# Altium footprint library texas.PCBLIB: 124 footprints (part 5 of 12)
Each footprint in its own frame and in the unit in brackets; x right, y up, seen from the top. Pads: shape width x height; smd on the part's side, far side on the other; paste and mask are expansions set on the pad; w line width, h text height; cw(c..) or ccw(c..) is an arc to the next point about the centre after c.
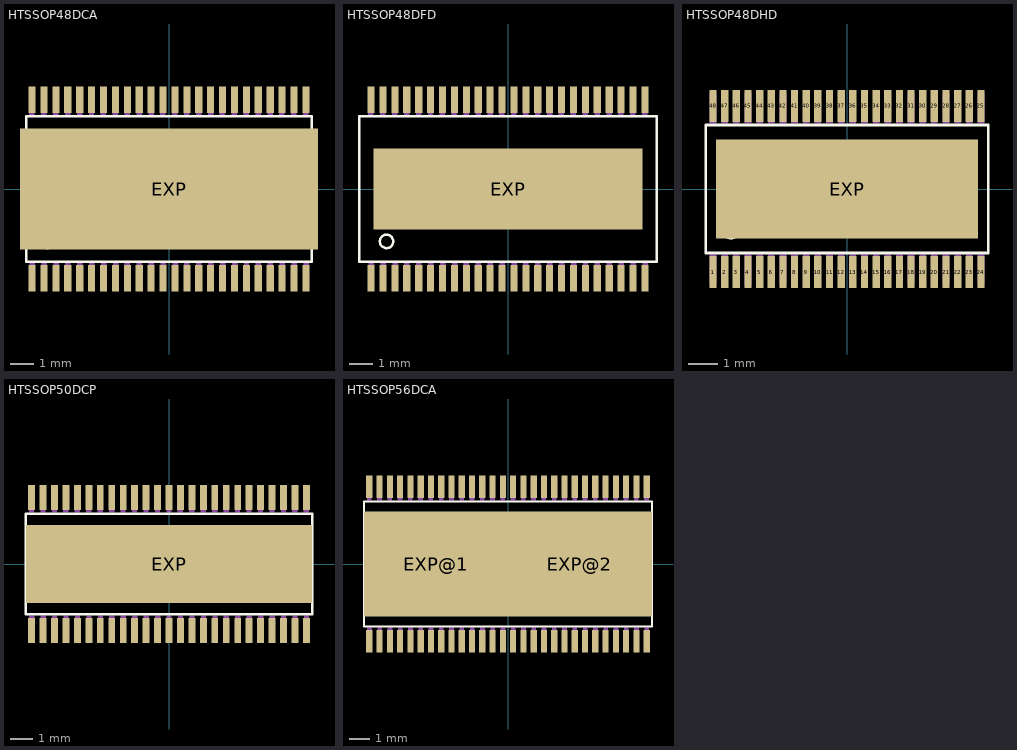
[diagram p4: the footprints below, top view; thin cyan lines are the x and y axes]

## HTSSOP48DCA [mm]
pads (49):
  rect 0.3x1.1 smd: 1(-5.75,-3.75) 2(-5.25,-3.75) 3(-4.75,-3.75) 4(-4.25,-3.75) 5(-3.75,-3.75) 6(-3.25,-3.75) 7(-2.75,-3.75) 8(-2.25,-3.75) 9(-1.75,-3.75) 10(-1.25,-3.75) 11(-0.75,-3.75) 12(-0.25,-3.75) 13(0.25,-3.75) 14(0.75,-3.75) 15(1.25,-3.75) 16(1.75,-3.75) 17(2.25,-3.75) 18(2.75,-3.75) 19(3.25,-3.75) 20(3.75,-3.75) 21(4.25,-3.75) 22(4.75,-3.75) 23(5.25,-3.75) 24(5.75,-3.75) 25(5.75,3.75) 26(5.25,3.75) 27(4.75,3.75) 28(4.25,3.75) 29(3.75,3.75) 30(3.25,3.75) 31(2.75,3.75) 32(2.25,3.75) 33(1.75,3.75) 34(1.25,3.75) 35(0.75,3.75) 36(0.25,3.75) 37(-0.25,3.75) 38(-0.75,3.75) 39(-1.25,3.75) 40(-1.75,3.75) 41(-2.25,3.75) 42(-2.75,3.75) 43(-3.25,3.75) 44(-3.75,3.75) 45(-4.25,3.75) 46(-4.75,3.75) 47(-5.25,3.75) 48(-5.75,3.75)
  rect 12.5x5.1 smd: EXP(0,0)
Top Overlay:
  circle w0.102: c-5.1,-2.2 r0.283
  lines w0.102: -6,-3.05 6,-3.05 6,3.05 -6,3.05 -6,-3.05
Top Paste:
  rectangle: -5.89,-4.285 -5.61,-3.215
  rectangle: -5.39,-4.285 -5.11,-3.215
  rectangle: -4.89,-4.285 -4.61,-3.215
  rectangle: -4.39,-4.285 -4.11,-3.215
  rectangle: -3.89,-4.285 -3.61,-3.215
  rectangle: -3.39,-4.285 -3.11,-3.215
  rectangle: -2.89,-4.285 -2.61,-3.215
  rectangle: -2.39,-4.285 -2.11,-3.215
  rectangle: -1.89,-4.285 -1.61,-3.215
  rectangle: -1.39,-4.285 -1.11,-3.215
  rectangle: -0.89,-4.285 -0.61,-3.215
  rectangle: -0.39,-4.285 -0.11,-3.215
  rectangle: 0.11,-4.285 0.39,-3.215
  rectangle: 0.61,-4.285 0.89,-3.215
  rectangle: 1.11,-4.285 1.39,-3.215
  rectangle: 1.61,-4.285 1.89,-3.215
  rectangle: 2.11,-4.285 2.39,-3.215
  rectangle: 2.61,-4.285 2.89,-3.215
  rectangle: 3.11,-4.285 3.39,-3.215
  rectangle: 3.61,-4.285 3.89,-3.215
  rectangle: 4.11,-4.285 4.39,-3.215
  rectangle: 4.61,-4.285 4.89,-3.215
  rectangle: 5.11,-4.285 5.39,-3.215
  rectangle: 5.61,-4.285 5.89,-3.215
  region: 5.89,4.285 5.61,4.285 5.61,3.215 5.89,3.215
  region: 5.39,4.285 5.11,4.285 5.11,3.215 5.39,3.215
  region: 4.89,4.285 4.61,4.285 4.61,3.215 4.89,3.215
  region: 4.39,4.285 4.11,4.285 4.11,3.215 4.39,3.215
  region: 3.89,4.285 3.61,4.285 3.61,3.215 3.89,3.215
  region: 3.39,4.285 3.11,4.285 3.11,3.215 3.39,3.215
  region: 2.89,4.285 2.61,4.285 2.61,3.215 2.89,3.215
  region: 2.39,4.285 2.11,4.285 2.11,3.215 2.39,3.215
  region: 1.89,4.285 1.61,4.285 1.61,3.215 1.89,3.215
  region: 1.39,4.285 1.11,4.285 1.11,3.215 1.39,3.215
  region: 0.89,4.285 0.61,4.285 0.61,3.215 0.89,3.215
  region: 0.39,4.285 0.11,4.285 0.11,3.215 0.39,3.215
  region: -0.11,4.285 -0.39,4.285 -0.39,3.215 -0.11,3.215
  region: -0.61,4.285 -0.89,4.285 -0.89,3.215 -0.61,3.215
  region: -1.11,4.285 -1.39,4.285 -1.39,3.215 -1.11,3.215
  region: -1.61,4.285 -1.89,4.285 -1.89,3.215 -1.61,3.215
  region: -2.11,4.285 -2.39,4.285 -2.39,3.215 -2.11,3.215
  region: -2.61,4.285 -2.89,4.285 -2.89,3.215 -2.61,3.215
  region: -3.11,4.285 -3.39,4.285 -3.39,3.215 -3.11,3.215
  region: -3.61,4.285 -3.89,4.285 -3.89,3.215 -3.61,3.215
  region: -4.11,4.285 -4.39,4.285 -4.39,3.215 -4.11,3.215
  region: -4.61,4.285 -4.89,4.285 -4.89,3.215 -4.61,3.215
  region: -5.11,4.285 -5.39,4.285 -5.39,3.215 -5.11,3.215
  region: -5.61,4.285 -5.89,4.285 -5.89,3.215 -5.61,3.215
Top Solder:
  rectangle: -5.905,-4.305 -5.595,-3.195
  rectangle: -5.405,-4.305 -5.095,-3.195
  rectangle: -4.905,-4.305 -4.595,-3.195
  rectangle: -4.405,-4.305 -4.095,-3.195
  rectangle: -3.905,-4.305 -3.595,-3.195
  rectangle: -3.405,-4.305 -3.095,-3.195
  rectangle: -2.905,-4.305 -2.595,-3.195
  rectangle: -2.405,-4.305 -2.095,-3.195
  rectangle: -1.905,-4.305 -1.595,-3.195
  rectangle: -1.405,-4.305 -1.095,-3.195
  rectangle: -0.905,-4.305 -0.595,-3.195
  rectangle: -0.405,-4.305 -0.095,-3.195
  rectangle: 0.095,-4.305 0.405,-3.195
  rectangle: 0.595,-4.305 0.905,-3.195
  rectangle: 1.095,-4.305 1.405,-3.195
  rectangle: 1.595,-4.305 1.905,-3.195
  rectangle: 2.095,-4.305 2.405,-3.195
  rectangle: 2.595,-4.305 2.905,-3.195
  rectangle: 3.095,-4.305 3.405,-3.195
  rectangle: 3.595,-4.305 3.905,-3.195
  rectangle: 4.095,-4.305 4.405,-3.195
  rectangle: 4.595,-4.305 4.905,-3.195
  rectangle: 5.095,-4.305 5.405,-3.195
  rectangle: 5.595,-4.305 5.905,-3.195
  region: 5.905,4.305 5.595,4.305 5.595,3.195 5.905,3.195
  region: 5.405,4.305 5.095,4.305 5.095,3.195 5.405,3.195
  region: 4.905,4.305 4.595,4.305 4.595,3.195 4.905,3.195
  region: 4.405,4.305 4.095,4.305 4.095,3.195 4.405,3.195
  region: 3.905,4.305 3.595,4.305 3.595,3.195 3.905,3.195
  region: 3.405,4.305 3.095,4.305 3.095,3.195 3.405,3.195
  region: 2.905,4.305 2.595,4.305 2.595,3.195 2.905,3.195
  region: 2.405,4.305 2.095,4.305 2.095,3.195 2.405,3.195
  region: 1.905,4.305 1.595,4.305 1.595,3.195 1.905,3.195
  region: 1.405,4.305 1.095,4.305 1.095,3.195 1.405,3.195
  region: 0.905,4.305 0.595,4.305 0.595,3.195 0.905,3.195
  region: 0.405,4.305 0.095,4.305 0.095,3.195 0.405,3.195
  region: -0.095,4.305 -0.405,4.305 -0.405,3.195 -0.095,3.195
  region: -0.595,4.305 -0.905,4.305 -0.905,3.195 -0.595,3.195
  region: -1.095,4.305 -1.405,4.305 -1.405,3.195 -1.095,3.195
  region: -1.595,4.305 -1.905,4.305 -1.905,3.195 -1.595,3.195
  region: -2.095,4.305 -2.405,4.305 -2.405,3.195 -2.095,3.195
  region: -2.595,4.305 -2.905,4.305 -2.905,3.195 -2.595,3.195
  region: -3.095,4.305 -3.405,4.305 -3.405,3.195 -3.095,3.195
  region: -3.595,4.305 -3.905,4.305 -3.905,3.195 -3.595,3.195
  region: -4.095,4.305 -4.405,4.305 -4.405,3.195 -4.095,3.195
  region: -4.595,4.305 -4.905,4.305 -4.905,3.195 -4.595,3.195
  region: -5.095,4.305 -5.405,4.305 -5.405,3.195 -5.095,3.195
  region: -5.595,4.305 -5.905,4.305 -5.905,3.195 -5.595,3.195
  rectangle: -6.245,-2.55 6.25,2.55
Mechanical 16:
  rectangle: -5.86,-4.15 -5.63,-3.095
  rectangle: -5.36,-4.15 -5.13,-3.095
  rectangle: -4.86,-4.15 -4.63,-3.095
  rectangle: -4.36,-4.15 -4.13,-3.095
  rectangle: -3.86,-4.15 -3.63,-3.095
  rectangle: -3.36,-4.15 -3.13,-3.095
  rectangle: -2.86,-4.15 -2.63,-3.095
  rectangle: -2.36,-4.15 -2.13,-3.095
  rectangle: -1.86,-4.15 -1.63,-3.095
  rectangle: -1.36,-4.15 -1.13,-3.095
  rectangle: -0.86,-4.15 -0.63,-3.095
  rectangle: -0.36,-4.15 -0.13,-3.095
  rectangle: 0.14,-4.15 0.37,-3.095
  rectangle: 0.64,-4.15 0.87,-3.095
  rectangle: 1.14,-4.15 1.37,-3.095
  rectangle: 1.64,-4.15 1.87,-3.095
  rectangle: 2.14,-4.15 2.37,-3.095
  rectangle: 2.64,-4.15 2.87,-3.095
  rectangle: 3.14,-4.15 3.37,-3.095
  rectangle: 3.64,-4.15 3.87,-3.095
  rectangle: 4.14,-4.15 4.37,-3.095
  rectangle: 4.64,-4.15 4.87,-3.095
  rectangle: 5.14,-4.15 5.37,-3.095
  rectangle: 5.64,-4.15 5.87,-3.095
  region: 5.86,4.15 5.63,4.15 5.63,3.095 5.86,3.095
  region: 5.36,4.15 5.13,4.15 5.13,3.095 5.36,3.095
  region: 4.86,4.15 4.63,4.15 4.63,3.095 4.86,3.095
  region: 4.36,4.15 4.13,4.15 4.13,3.095 4.36,3.095
  region: 3.86,4.15 3.63,4.15 3.63,3.095 3.86,3.095
  region: 3.36,4.15 3.13,4.15 3.13,3.095 3.36,3.095
  region: 2.86,4.15 2.63,4.15 2.63,3.095 2.86,3.095
  region: 2.36,4.15 2.13,4.15 2.13,3.095 2.36,3.095
  region: 1.86,4.15 1.63,4.15 1.63,3.095 1.86,3.095
  region: 1.36,4.15 1.13,4.15 1.13,3.095 1.36,3.095
  region: 0.86,4.15 0.63,4.15 0.63,3.095 0.86,3.095
  region: 0.36,4.15 0.13,4.15 0.13,3.095 0.36,3.095
  region: -0.14,4.15 -0.37,4.15 -0.37,3.095 -0.14,3.095
  region: -0.64,4.15 -0.87,4.15 -0.87,3.095 -0.64,3.095
  region: -1.14,4.15 -1.37,4.15 -1.37,3.095 -1.14,3.095
  region: -1.64,4.15 -1.87,4.15 -1.87,3.095 -1.64,3.095
  region: -2.14,4.15 -2.37,4.15 -2.37,3.095 -2.14,3.095
  region: -2.64,4.15 -2.87,4.15 -2.87,3.095 -2.64,3.095
  region: -3.14,4.15 -3.37,4.15 -3.37,3.095 -3.14,3.095
  region: -3.64,4.15 -3.87,4.15 -3.87,3.095 -3.64,3.095
  region: -4.14,4.15 -4.37,4.15 -4.37,3.095 -4.14,3.095
  region: -4.64,4.15 -4.87,4.15 -4.87,3.095 -4.64,3.095
  region: -5.14,4.15 -5.37,4.15 -5.37,3.095 -5.14,3.095
  region: -5.64,4.15 -5.87,4.15 -5.87,3.095 -5.64,3.095

## HTSSOP48DFD [mm]
pads (49):
  rect 0.3x1.1 smd: 1(-5.75,-3.75) 2(-5.25,-3.75) 3(-4.75,-3.75) 4(-4.25,-3.75) 5(-3.75,-3.75) 6(-3.25,-3.75) 7(-2.75,-3.75) 8(-2.25,-3.75) 9(-1.75,-3.75) 10(-1.25,-3.75) 11(-0.75,-3.75) 12(-0.25,-3.75) 13(0.25,-3.75) 14(0.75,-3.75) 15(1.25,-3.75) 16(1.75,-3.75) 17(2.25,-3.75) 18(2.75,-3.75) 19(3.25,-3.75) 20(3.75,-3.75) 21(4.25,-3.75) 22(4.75,-3.75) 23(5.25,-3.75) 24(5.75,-3.75) 25(5.75,3.75) 26(5.25,3.75) 27(4.75,3.75) 28(4.25,3.75) 29(3.75,3.75) 30(3.25,3.75) 31(2.75,3.75) 32(2.25,3.75) 33(1.75,3.75) 34(1.25,3.75) 35(0.75,3.75) 36(0.25,3.75) 37(-0.25,3.75) 38(-0.75,3.75) 39(-1.25,3.75) 40(-1.75,3.75) 41(-2.25,3.75) 42(-2.75,3.75) 43(-3.25,3.75) 44(-3.75,3.75) 45(-4.25,3.75) 46(-4.75,3.75) 47(-5.25,3.75) 48(-5.75,3.75)
  rect 11.3x3.4 smd: EXP(0,0)
Top Overlay:
  circle w0.102: c-5.1,-2.2 r0.283
  lines w0.102: -6.25,-3.05 6.25,-3.05 6.25,3.05 -6.25,3.05 -6.25,-3.05
Top Paste:
  rectangle: -5.89,-4.285 -5.61,-3.215
  rectangle: -5.39,-4.285 -5.11,-3.215
  rectangle: -4.89,-4.285 -4.61,-3.215
  rectangle: -4.39,-4.285 -4.11,-3.215
  rectangle: -3.89,-4.285 -3.61,-3.215
  rectangle: -3.39,-4.285 -3.11,-3.215
  rectangle: -2.89,-4.285 -2.61,-3.215
  rectangle: -2.39,-4.285 -2.11,-3.215
  rectangle: -1.89,-4.285 -1.61,-3.215
  rectangle: -1.39,-4.285 -1.11,-3.215
  rectangle: -0.89,-4.285 -0.61,-3.215
  rectangle: -0.39,-4.285 -0.11,-3.215
  rectangle: 0.11,-4.285 0.39,-3.215
  rectangle: 0.61,-4.285 0.89,-3.215
  rectangle: 1.11,-4.285 1.39,-3.215
  rectangle: 1.61,-4.285 1.89,-3.215
  rectangle: 2.11,-4.285 2.39,-3.215
  rectangle: 2.61,-4.285 2.89,-3.215
  rectangle: 3.11,-4.285 3.39,-3.215
  rectangle: 3.61,-4.285 3.89,-3.215
  rectangle: 4.11,-4.285 4.39,-3.215
  rectangle: 4.61,-4.285 4.89,-3.215
  rectangle: 5.11,-4.285 5.39,-3.215
  rectangle: 5.61,-4.285 5.89,-3.215
  region: 5.89,4.285 5.61,4.285 5.61,3.215 5.89,3.215
  region: 5.39,4.285 5.11,4.285 5.11,3.215 5.39,3.215
  region: 4.89,4.285 4.61,4.285 4.61,3.215 4.89,3.215
  region: 4.39,4.285 4.11,4.285 4.11,3.215 4.39,3.215
  region: 3.89,4.285 3.61,4.285 3.61,3.215 3.89,3.215
  region: 3.39,4.285 3.11,4.285 3.11,3.215 3.39,3.215
  region: 2.89,4.285 2.61,4.285 2.61,3.215 2.89,3.215
  region: 2.39,4.285 2.11,4.285 2.11,3.215 2.39,3.215
  region: 1.89,4.285 1.61,4.285 1.61,3.215 1.89,3.215
  region: 1.39,4.285 1.11,4.285 1.11,3.215 1.39,3.215
  region: 0.89,4.285 0.61,4.285 0.61,3.215 0.89,3.215
  region: 0.39,4.285 0.11,4.285 0.11,3.215 0.39,3.215
  region: -0.11,4.285 -0.39,4.285 -0.39,3.215 -0.11,3.215
  region: -0.61,4.285 -0.89,4.285 -0.89,3.215 -0.61,3.215
  region: -1.11,4.285 -1.39,4.285 -1.39,3.215 -1.11,3.215
  region: -1.61,4.285 -1.89,4.285 -1.89,3.215 -1.61,3.215
  region: -2.11,4.285 -2.39,4.285 -2.39,3.215 -2.11,3.215
  region: -2.61,4.285 -2.89,4.285 -2.89,3.215 -2.61,3.215
  region: -3.11,4.285 -3.39,4.285 -3.39,3.215 -3.11,3.215
  region: -3.61,4.285 -3.89,4.285 -3.89,3.215 -3.61,3.215
  region: -4.11,4.285 -4.39,4.285 -4.39,3.215 -4.11,3.215
  region: -4.61,4.285 -4.89,4.285 -4.89,3.215 -4.61,3.215
  region: -5.11,4.285 -5.39,4.285 -5.39,3.215 -5.11,3.215
  region: -5.61,4.285 -5.89,4.285 -5.89,3.215 -5.61,3.215
Top Solder:
  rectangle: -5.905,-4.305 -5.595,-3.195
  rectangle: -5.405,-4.305 -5.095,-3.195
  rectangle: -4.905,-4.305 -4.595,-3.195
  rectangle: -4.405,-4.305 -4.095,-3.195
  rectangle: -3.905,-4.305 -3.595,-3.195
  rectangle: -3.405,-4.305 -3.095,-3.195
  rectangle: -2.905,-4.305 -2.595,-3.195
  rectangle: -2.405,-4.305 -2.095,-3.195
  rectangle: -1.905,-4.305 -1.595,-3.195
  rectangle: -1.405,-4.305 -1.095,-3.195
  rectangle: -0.905,-4.305 -0.595,-3.195
  rectangle: -0.405,-4.305 -0.095,-3.195
  rectangle: 0.095,-4.305 0.405,-3.195
  rectangle: 0.595,-4.305 0.905,-3.195
  rectangle: 1.095,-4.305 1.405,-3.195
  rectangle: 1.595,-4.305 1.905,-3.195
  rectangle: 2.095,-4.305 2.405,-3.195
  rectangle: 2.595,-4.305 2.905,-3.195
  rectangle: 3.095,-4.305 3.405,-3.195
  rectangle: 3.595,-4.305 3.905,-3.195
  rectangle: 4.095,-4.305 4.405,-3.195
  rectangle: 4.595,-4.305 4.905,-3.195
  rectangle: 5.095,-4.305 5.405,-3.195
  rectangle: 5.595,-4.305 5.905,-3.195
  region: 5.905,4.305 5.595,4.305 5.595,3.195 5.905,3.195
  region: 5.405,4.305 5.095,4.305 5.095,3.195 5.405,3.195
  region: 4.905,4.305 4.595,4.305 4.595,3.195 4.905,3.195
  region: 4.405,4.305 4.095,4.305 4.095,3.195 4.405,3.195
  region: 3.905,4.305 3.595,4.305 3.595,3.195 3.905,3.195
  region: 3.405,4.305 3.095,4.305 3.095,3.195 3.405,3.195
  region: 2.905,4.305 2.595,4.305 2.595,3.195 2.905,3.195
  region: 2.405,4.305 2.095,4.305 2.095,3.195 2.405,3.195
  region: 1.905,4.305 1.595,4.305 1.595,3.195 1.905,3.195
  region: 1.405,4.305 1.095,4.305 1.095,3.195 1.405,3.195
  region: 0.905,4.305 0.595,4.305 0.595,3.195 0.905,3.195
  region: 0.405,4.305 0.095,4.305 0.095,3.195 0.405,3.195
  region: -0.095,4.305 -0.405,4.305 -0.405,3.195 -0.095,3.195
  region: -0.595,4.305 -0.905,4.305 -0.905,3.195 -0.595,3.195
  region: -1.095,4.305 -1.405,4.305 -1.405,3.195 -1.095,3.195
  region: -1.595,4.305 -1.905,4.305 -1.905,3.195 -1.595,3.195
  region: -2.095,4.305 -2.405,4.305 -2.405,3.195 -2.095,3.195
  region: -2.595,4.305 -2.905,4.305 -2.905,3.195 -2.595,3.195
  region: -3.095,4.305 -3.405,4.305 -3.405,3.195 -3.095,3.195
  region: -3.595,4.305 -3.905,4.305 -3.905,3.195 -3.595,3.195
  region: -4.095,4.305 -4.405,4.305 -4.405,3.195 -4.095,3.195
  region: -4.595,4.305 -4.905,4.305 -4.905,3.195 -4.595,3.195
  region: -5.095,4.305 -5.405,4.305 -5.405,3.195 -5.095,3.195
  region: -5.595,4.305 -5.905,4.305 -5.905,3.195 -5.595,3.195
  rectangle: -5.65,-1.7 5.65,1.7
Mechanical 16:
  rectangle: -5.86,-4.15 -5.63,-3.095
  rectangle: -5.36,-4.15 -5.13,-3.095
  rectangle: -4.86,-4.15 -4.63,-3.095
  rectangle: -4.36,-4.15 -4.13,-3.095
  rectangle: -3.86,-4.15 -3.63,-3.095
  rectangle: -3.36,-4.15 -3.13,-3.095
  rectangle: -2.86,-4.15 -2.63,-3.095
  rectangle: -2.36,-4.15 -2.13,-3.095
  rectangle: -1.86,-4.15 -1.63,-3.095
  rectangle: -1.36,-4.15 -1.13,-3.095
  rectangle: -0.86,-4.15 -0.63,-3.095
  rectangle: -0.36,-4.15 -0.13,-3.095
  rectangle: 0.14,-4.15 0.37,-3.095
  rectangle: 0.64,-4.15 0.87,-3.095
  rectangle: 1.14,-4.15 1.37,-3.095
  rectangle: 1.64,-4.15 1.87,-3.095
  rectangle: 2.14,-4.15 2.37,-3.095
  rectangle: 2.64,-4.15 2.87,-3.095
  rectangle: 3.14,-4.15 3.37,-3.095
  rectangle: 3.64,-4.15 3.87,-3.095
  rectangle: 4.14,-4.15 4.37,-3.095
  rectangle: 4.64,-4.15 4.87,-3.095
  rectangle: 5.14,-4.15 5.37,-3.095
  rectangle: 5.64,-4.15 5.87,-3.095
  region: 5.86,4.15 5.63,4.15 5.63,3.095 5.86,3.095
  region: 5.36,4.15 5.13,4.15 5.13,3.095 5.36,3.095
  region: 4.86,4.15 4.63,4.15 4.63,3.095 4.86,3.095
  region: 4.36,4.15 4.13,4.15 4.13,3.095 4.36,3.095
  region: 3.86,4.15 3.63,4.15 3.63,3.095 3.86,3.095
  region: 3.36,4.15 3.13,4.15 3.13,3.095 3.36,3.095
  region: 2.86,4.15 2.63,4.15 2.63,3.095 2.86,3.095
  region: 2.36,4.15 2.13,4.15 2.13,3.095 2.36,3.095
  region: 1.86,4.15 1.63,4.15 1.63,3.095 1.86,3.095
  region: 1.36,4.15 1.13,4.15 1.13,3.095 1.36,3.095
  region: 0.86,4.15 0.63,4.15 0.63,3.095 0.86,3.095
  region: 0.36,4.15 0.13,4.15 0.13,3.095 0.36,3.095
  region: -0.14,4.15 -0.37,4.15 -0.37,3.095 -0.14,3.095
  region: -0.64,4.15 -0.87,4.15 -0.87,3.095 -0.64,3.095
  region: -1.14,4.15 -1.37,4.15 -1.37,3.095 -1.14,3.095
  region: -1.64,4.15 -1.87,4.15 -1.87,3.095 -1.64,3.095
  region: -2.14,4.15 -2.37,4.15 -2.37,3.095 -2.14,3.095
  region: -2.64,4.15 -2.87,4.15 -2.87,3.095 -2.64,3.095
  region: -3.14,4.15 -3.37,4.15 -3.37,3.095 -3.14,3.095
  region: -3.64,4.15 -3.87,4.15 -3.87,3.095 -3.64,3.095
  region: -4.14,4.15 -4.37,4.15 -4.37,3.095 -4.14,3.095
  region: -4.64,4.15 -4.87,4.15 -4.87,3.095 -4.64,3.095
  region: -5.14,4.15 -5.37,4.15 -5.37,3.095 -5.14,3.095
  region: -5.64,4.15 -5.87,4.15 -5.87,3.095 -5.64,3.095

## HTSSOP48DHD [mm]
pads (49):
  rect 0.25x1.1 smd: 1(-4.6,-2.85) 2(-4.2,-2.85) 3(-3.8,-2.85) 4(-3.4,-2.85) 5(-3,-2.85) 6(-2.6,-2.85) 7(-2.2,-2.85) 8(-1.8,-2.85) 9(-1.4,-2.85) 10(-1,-2.85) 11(-0.6,-2.85) 12(-0.2,-2.85) 13(0.2,-2.85) 14(0.6,-2.85) 15(1,-2.85) 16(1.4,-2.85) 17(1.8,-2.85) 18(2.2,-2.85) 19(2.6,-2.85) 20(3,-2.85) 21(3.4,-2.85) 22(3.8,-2.85) 23(4.2,-2.85) 24(4.6,-2.85) 25(4.6,2.85) 26(4.2,2.85) 27(3.8,2.85) 28(3.4,2.85) 29(3,2.85) 30(2.6,2.85) 31(2.2,2.85) 32(1.8,2.85) 33(1.4,2.85) 34(1,2.85) 35(0.6,2.85) 36(0.2,2.85) 37(-0.2,2.85) 38(-0.6,2.85) 39(-1,2.85) 40(-1.4,2.85) 41(-1.8,2.85) 42(-2.2,2.85) 43(-2.6,2.85) 44(-3,2.85) 45(-3.4,2.85) 46(-3.8,2.85) 47(-4.2,2.85) 48(-4.6,2.85)
  rect 9x3.4 smd: EXP(0,0)
Top Overlay:
  circle w0.102: c-4,-1.4 r0.283
  lines w0.102: -4.85,-2.2 4.85,-2.2 4.85,2.205 -4.85,2.205 -4.85,-2.2
Top Paste:
  rectangle: -4.71,-3.385 -4.49,-2.32
  rectangle: -4.31,-3.385 -4.09,-2.32
  rectangle: -3.91,-3.385 -3.69,-2.32
  rectangle: -3.51,-3.385 -3.29,-2.32
  rectangle: -3.11,-3.385 -2.89,-2.32
  rectangle: -2.71,-3.385 -2.49,-2.32
  rectangle: -2.31,-3.385 -2.09,-2.32
  rectangle: -1.91,-3.385 -1.69,-2.32
  rectangle: -1.51,-3.385 -1.29,-2.32
  rectangle: -1.11,-3.385 -0.89,-2.32
  rectangle: -0.71,-3.385 -0.49,-2.32
  rectangle: -0.31,-3.385 -0.09,-2.32
  rectangle: 0.09,-3.385 0.31,-2.32
  rectangle: 0.49,-3.385 0.71,-2.32
  rectangle: 0.89,-3.385 1.11,-2.32
  rectangle: 1.29,-3.385 1.51,-2.32
  rectangle: 1.69,-3.385 1.91,-2.32
  rectangle: 2.09,-3.385 2.31,-2.32
  rectangle: 2.49,-3.385 2.71,-2.32
  rectangle: 2.89,-3.385 3.11,-2.32
  rectangle: 3.29,-3.385 3.51,-2.32
  rectangle: 3.69,-3.385 3.91,-2.32
  rectangle: 4.09,-3.385 4.31,-2.32
  rectangle: 4.49,-3.385 4.71,-2.32
  region: 4.71,3.385 4.49,3.385 4.49,2.32 4.71,2.32
  region: 4.31,3.385 4.09,3.385 4.09,2.32 4.31,2.32
  region: 3.91,3.385 3.69,3.385 3.69,2.32 3.91,2.32
  region: 3.51,3.385 3.29,3.385 3.29,2.32 3.51,2.32
  region: 3.11,3.385 2.89,3.385 2.89,2.32 3.11,2.32
  region: 2.71,3.385 2.49,3.385 2.49,2.32 2.71,2.32
  region: 2.31,3.385 2.09,3.385 2.09,2.32 2.31,2.32
  region: 1.91,3.385 1.69,3.385 1.69,2.32 1.91,2.32
  region: 1.51,3.385 1.29,3.385 1.29,2.32 1.51,2.32
  region: 1.11,3.385 0.89,3.385 0.89,2.32 1.11,2.32
  region: 0.71,3.385 0.49,3.385 0.49,2.32 0.71,2.32
  region: 0.31,3.385 0.09,3.385 0.09,2.32 0.31,2.32
  region: -0.09,3.385 -0.31,3.385 -0.31,2.32 -0.09,2.32
  region: -0.49,3.385 -0.71,3.385 -0.71,2.32 -0.49,2.32
  region: -0.89,3.385 -1.11,3.385 -1.11,2.32 -0.89,2.32
  region: -1.29,3.385 -1.51,3.385 -1.51,2.32 -1.29,2.32
  region: -1.69,3.385 -1.91,3.385 -1.91,2.32 -1.69,2.32
  region: -2.09,3.385 -2.31,3.385 -2.31,2.32 -2.09,2.32
  region: -2.49,3.385 -2.71,3.385 -2.71,2.32 -2.49,2.32
  region: -2.89,3.385 -3.11,3.385 -3.11,2.32 -2.89,2.32
  region: -3.29,3.385 -3.51,3.385 -3.51,2.32 -3.29,2.32
  region: -3.69,3.385 -3.91,3.385 -3.91,2.32 -3.69,2.32
  region: -4.09,3.385 -4.31,3.385 -4.31,2.32 -4.09,2.32
  region: -4.49,3.385 -4.71,3.385 -4.71,2.32 -4.49,2.32
Top Solder:
  rectangle: -4.73,-3.405 -4.47,-2.295
  rectangle: -4.33,-3.405 -4.07,-2.295
  rectangle: -3.93,-3.405 -3.67,-2.295
  rectangle: -3.53,-3.405 -3.27,-2.295
  rectangle: -3.13,-3.405 -2.87,-2.295
  rectangle: -2.73,-3.405 -2.47,-2.295
  rectangle: -2.33,-3.405 -2.07,-2.295
  rectangle: -1.93,-3.405 -1.67,-2.295
  rectangle: -1.53,-3.405 -1.27,-2.295
  rectangle: -1.13,-3.405 -0.87,-2.295
  rectangle: -0.73,-3.405 -0.47,-2.295
  rectangle: -0.33,-3.405 -0.07,-2.295
  rectangle: 0.07,-3.405 0.33,-2.295
  rectangle: 0.47,-3.405 0.73,-2.295
  rectangle: 0.87,-3.405 1.13,-2.295
  rectangle: 1.27,-3.405 1.53,-2.295
  rectangle: 1.67,-3.405 1.93,-2.295
  rectangle: 2.07,-3.405 2.33,-2.295
  rectangle: 2.47,-3.405 2.73,-2.295
  rectangle: 2.87,-3.405 3.13,-2.295
  rectangle: 3.27,-3.405 3.53,-2.295
  rectangle: 3.67,-3.405 3.93,-2.295
  rectangle: 4.07,-3.405 4.33,-2.295
  rectangle: 4.47,-3.405 4.73,-2.295
  region: 4.73,3.405 4.47,3.405 4.47,2.295 4.73,2.295
  region: 4.33,3.405 4.07,3.405 4.07,2.295 4.33,2.295
  region: 3.93,3.405 3.67,3.405 3.67,2.295 3.93,2.295
  region: 3.53,3.405 3.27,3.405 3.27,2.295 3.53,2.295
  region: 3.13,3.405 2.87,3.405 2.87,2.295 3.13,2.295
  region: 2.73,3.405 2.47,3.405 2.47,2.295 2.73,2.295
  region: 2.33,3.405 2.07,3.405 2.07,2.295 2.33,2.295
  region: 1.93,3.405 1.67,3.405 1.67,2.295 1.93,2.295
  region: 1.53,3.405 1.27,3.405 1.27,2.295 1.53,2.295
  region: 1.13,3.405 0.87,3.405 0.87,2.295 1.13,2.295
  region: 0.73,3.405 0.47,3.405 0.47,2.295 0.73,2.295
  region: 0.33,3.405 0.07,3.405 0.07,2.295 0.33,2.295
  region: -0.07,3.405 -0.33,3.405 -0.33,2.295 -0.07,2.295
  region: -0.47,3.405 -0.73,3.405 -0.73,2.295 -0.47,2.295
  region: -0.87,3.405 -1.13,3.405 -1.13,2.295 -0.87,2.295
  region: -1.27,3.405 -1.53,3.405 -1.53,2.295 -1.27,2.295
  region: -1.67,3.405 -1.93,3.405 -1.93,2.295 -1.67,2.295
  region: -2.07,3.405 -2.33,3.405 -2.33,2.295 -2.07,2.295
  region: -2.47,3.405 -2.73,3.405 -2.73,2.295 -2.47,2.295
  region: -2.87,3.405 -3.13,3.405 -3.13,2.295 -2.87,2.295
  region: -3.27,3.405 -3.53,3.405 -3.53,2.295 -3.27,2.295
  region: -3.67,3.405 -3.93,3.405 -3.93,2.295 -3.67,2.295
  region: -4.07,3.405 -4.33,3.405 -4.33,2.295 -4.07,2.295
  region: -4.47,3.405 -4.73,3.405 -4.73,2.295 -4.47,2.295
  rectangle: -4.5,-1.7 4.5,1.7
Mechanical 16:
  rectangle: -4.715,-3.3 -4.485,-2.25
  rectangle: -4.315,-3.3 -4.085,-2.25
  rectangle: -3.915,-3.3 -3.685,-2.25
  rectangle: -3.515,-3.3 -3.285,-2.25
  rectangle: -3.115,-3.3 -2.885,-2.25
  rectangle: -2.715,-3.3 -2.485,-2.25
  rectangle: -2.315,-3.3 -2.085,-2.25
  rectangle: -1.915,-3.3 -1.685,-2.25
  rectangle: -1.515,-3.3 -1.285,-2.25
  rectangle: -1.115,-3.3 -0.885,-2.25
  rectangle: -0.715,-3.3 -0.485,-2.25
  rectangle: -0.315,-3.3 -0.085,-2.25
  rectangle: 0.085,-3.3 0.315,-2.25
  rectangle: 0.485,-3.3 0.715,-2.25
  rectangle: 0.885,-3.3 1.115,-2.25
  rectangle: 1.285,-3.3 1.515,-2.25
  rectangle: 1.685,-3.3 1.915,-2.25
  rectangle: 2.085,-3.3 2.315,-2.25
  rectangle: 2.485,-3.3 2.715,-2.25
  rectangle: 2.885,-3.3 3.115,-2.25
  rectangle: 3.285,-3.3 3.515,-2.25
  rectangle: 3.685,-3.3 3.915,-2.25
  rectangle: 4.085,-3.3 4.315,-2.25
  rectangle: 4.485,-3.3 4.715,-2.25
  region: 4.715,3.3 4.485,3.3 4.485,2.25 4.715,2.25
  region: 4.315,3.3 4.085,3.3 4.085,2.25 4.315,2.25
  region: 3.915,3.3 3.685,3.3 3.685,2.25 3.915,2.25
  region: 3.515,3.3 3.285,3.3 3.285,2.25 3.515,2.25
  region: 3.115,3.3 2.885,3.3 2.885,2.25 3.115,2.25
  region: 2.715,3.3 2.485,3.3 2.485,2.25 2.715,2.25
  region: 2.315,3.3 2.085,3.3 2.085,2.25 2.315,2.25
  region: 1.915,3.3 1.685,3.3 1.685,2.25 1.915,2.25
  region: 1.515,3.3 1.285,3.3 1.285,2.25 1.515,2.25
  region: 1.115,3.3 0.885,3.3 0.885,2.25 1.115,2.25
  region: 0.715,3.3 0.485,3.3 0.485,2.25 0.715,2.25
  region: 0.315,3.3 0.085,3.3 0.085,2.25 0.315,2.25
  region: -0.085,3.3 -0.315,3.3 -0.315,2.25 -0.085,2.25
  region: -0.485,3.3 -0.715,3.3 -0.715,2.25 -0.485,2.25
  region: -0.885,3.3 -1.115,3.3 -1.115,2.25 -0.885,2.25
  region: -1.285,3.3 -1.515,3.3 -1.515,2.25 -1.285,2.25
  region: -1.685,3.3 -1.915,3.3 -1.915,2.25 -1.685,2.25
  region: -2.085,3.3 -2.315,3.3 -2.315,2.25 -2.085,2.25
  region: -2.485,3.3 -2.715,3.3 -2.715,2.25 -2.485,2.25
  region: -2.885,3.3 -3.115,3.3 -3.115,2.25 -2.885,2.25
  region: -3.285,3.3 -3.515,3.3 -3.515,2.25 -3.285,2.25
  region: -3.685,3.3 -3.915,3.3 -3.915,2.25 -3.685,2.25
  region: -4.085,3.3 -4.315,3.3 -4.315,2.25 -4.085,2.25
  region: -4.485,3.3 -4.715,3.3 -4.715,2.25 -4.485,2.25

## HTSSOP50DCP [mm]
pads (51):
  rect 0.3x1.1 smd: 1(-6,-2.9) 2(-5.5,-2.9) 3(-5,-2.9) 4(-4.5,-2.9) 5(-4,-2.9) 6(-3.5,-2.9) 7(-3,-2.9) 8(-2.5,-2.9) 9(-2,-2.9) 10(-1.5,-2.9) 11(-1,-2.9) 12(-0.5,-2.9) 13(0,-2.9) 14(0.5,-2.9) 15(1,-2.9) 16(1.5,-2.9) 17(2,-2.9) 18(2.5,-2.9) 19(3,-2.9) 20(3.5,-2.9) 21(4,-2.9) 22(4.5,-2.9) 23(5,-2.9) 24(5.5,-2.9) 25(6,-2.9) 26(6,2.9) 27(5.5,2.9) 28(5,2.9) 29(4.5,2.9) 30(4,2.9) 31(3.5,2.9) 32(3,2.9) 33(2.5,2.9) 34(2,2.9) 35(1.5,2.9) 36(1,2.9) 37(0.5,2.9) 38(0,2.9) 39(-0.5,2.9) 40(-1,2.9) 41(-1.5,2.9) 42(-2,2.9) 43(-2.5,2.9) 44(-3,2.9) 45(-3.5,2.9) 46(-4,2.9) 47(-4.5,2.9) 48(-5,2.9) 49(-5.5,2.9) 50(-6,2.9)
  rect 12.5x3.4 smd: EXP(0,0)
Top Overlay:
  circle w0.102: c-5.695,-1.35 r0.283
  lines w0.102: -6.25,-2.2 6.25,-2.2 6.25,2.2 -6.25,2.2 -6.25,-2.2
Top Paste:
  rectangle: -6.14,-3.435 -5.86,-2.365
  rectangle: -5.64,-3.435 -5.36,-2.365
  rectangle: -5.14,-3.435 -4.86,-2.365
  rectangle: -4.64,-3.435 -4.36,-2.365
  rectangle: -4.14,-3.435 -3.86,-2.365
  rectangle: -3.64,-3.435 -3.36,-2.365
  rectangle: -3.14,-3.435 -2.86,-2.365
  rectangle: -2.64,-3.435 -2.36,-2.365
  rectangle: -2.14,-3.435 -1.86,-2.365
  rectangle: -1.64,-3.435 -1.36,-2.365
  rectangle: -1.14,-3.435 -0.86,-2.365
  rectangle: -0.64,-3.435 -0.36,-2.365
  rectangle: -0.14,-3.435 0.14,-2.365
  rectangle: 0.36,-3.435 0.64,-2.365
  rectangle: 0.86,-3.435 1.14,-2.365
  rectangle: 1.36,-3.435 1.64,-2.365
  rectangle: 1.86,-3.435 2.14,-2.365
  rectangle: 2.36,-3.435 2.64,-2.365
  rectangle: 2.86,-3.435 3.14,-2.365
  rectangle: 3.36,-3.435 3.64,-2.365
  rectangle: 3.86,-3.435 4.14,-2.365
  rectangle: 4.36,-3.435 4.64,-2.365
  rectangle: 4.86,-3.435 5.14,-2.365
  rectangle: 5.36,-3.435 5.64,-2.365
  rectangle: 5.86,-3.435 6.14,-2.365
  region: 6.14,3.435 5.86,3.435 5.86,2.365 6.14,2.365
  region: 5.64,3.435 5.36,3.435 5.36,2.365 5.64,2.365
  region: 5.14,3.435 4.86,3.435 4.86,2.365 5.14,2.365
  region: 4.64,3.435 4.36,3.435 4.36,2.365 4.64,2.365
  region: 4.14,3.435 3.86,3.435 3.86,2.365 4.14,2.365
  region: 3.64,3.435 3.36,3.435 3.36,2.365 3.64,2.365
  region: 3.14,3.435 2.86,3.435 2.86,2.365 3.14,2.365
  region: 2.64,3.435 2.36,3.435 2.36,2.365 2.64,2.365
  region: 2.14,3.435 1.86,3.435 1.86,2.365 2.14,2.365
  region: 1.64,3.435 1.36,3.435 1.36,2.365 1.64,2.365
  region: 1.14,3.435 0.86,3.435 0.86,2.365 1.14,2.365
  region: 0.64,3.435 0.36,3.435 0.36,2.365 0.64,2.365
  region: 0.14,3.435 -0.14,3.435 -0.14,2.365 0.14,2.365
  region: -0.36,3.435 -0.64,3.435 -0.64,2.365 -0.36,2.365
  region: -0.86,3.435 -1.14,3.435 -1.14,2.365 -0.86,2.365
  region: -1.36,3.435 -1.64,3.435 -1.64,2.365 -1.36,2.365
  region: -1.86,3.435 -2.14,3.435 -2.14,2.365 -1.86,2.365
  region: -2.36,3.435 -2.64,3.435 -2.64,2.365 -2.36,2.365
  region: -2.86,3.435 -3.14,3.435 -3.14,2.365 -2.86,2.365
  region: -3.36,3.435 -3.64,3.435 -3.64,2.365 -3.36,2.365
  region: -3.86,3.435 -4.14,3.435 -4.14,2.365 -3.86,2.365
  region: -4.36,3.435 -4.64,3.435 -4.64,2.365 -4.36,2.365
  region: -4.86,3.435 -5.14,3.435 -5.14,2.365 -4.86,2.365
  region: -5.36,3.435 -5.64,3.435 -5.64,2.365 -5.36,2.365
  region: -5.86,3.435 -6.14,3.435 -6.14,2.365 -5.86,2.365
Top Solder:
  rectangle: -6.155,-3.455 -5.845,-2.345
  rectangle: -5.655,-3.455 -5.345,-2.345
  rectangle: -5.155,-3.455 -4.845,-2.345
  rectangle: -4.655,-3.455 -4.345,-2.345
  rectangle: -4.155,-3.455 -3.845,-2.345
  rectangle: -3.655,-3.455 -3.345,-2.345
  rectangle: -3.155,-3.455 -2.845,-2.345
  rectangle: -2.655,-3.455 -2.345,-2.345
  rectangle: -2.155,-3.455 -1.845,-2.345
  rectangle: -1.655,-3.455 -1.345,-2.345
  rectangle: -1.155,-3.455 -0.845,-2.345
  rectangle: -0.655,-3.455 -0.345,-2.345
  rectangle: -0.155,-3.455 0.155,-2.345
  rectangle: 0.345,-3.455 0.655,-2.345
  rectangle: 0.845,-3.455 1.155,-2.345
  rectangle: 1.345,-3.455 1.655,-2.345
  rectangle: 1.845,-3.455 2.155,-2.345
  rectangle: 2.345,-3.455 2.655,-2.345
  rectangle: 2.845,-3.455 3.155,-2.345
  rectangle: 3.345,-3.455 3.655,-2.345
  rectangle: 3.845,-3.455 4.155,-2.345
  rectangle: 4.345,-3.455 4.655,-2.345
  rectangle: 4.845,-3.455 5.155,-2.345
  rectangle: 5.345,-3.455 5.655,-2.345
  rectangle: 5.845,-3.455 6.155,-2.345
  region: 6.155,3.455 5.845,3.455 5.845,2.345 6.155,2.345
  region: 5.655,3.455 5.345,3.455 5.345,2.345 5.655,2.345
  region: 5.155,3.455 4.845,3.455 4.845,2.345 5.155,2.345
  rectangle: -6.25,-1.7 6.25,1.7
  region: 4.655,3.455 4.345,3.455 4.345,2.345 4.655,2.345
  region: 4.155,3.455 3.845,3.455 3.845,2.345 4.155,2.345
  region: 3.655,3.455 3.345,3.455 3.345,2.345 3.655,2.345
  region: 3.155,3.455 2.845,3.455 2.845,2.345 3.155,2.345
  region: 2.655,3.455 2.345,3.455 2.345,2.345 2.655,2.345
  region: 2.155,3.455 1.845,3.455 1.845,2.345 2.155,2.345
  region: 1.655,3.455 1.345,3.455 1.345,2.345 1.655,2.345
  region: 1.155,3.455 0.845,3.455 0.845,2.345 1.155,2.345
  region: 0.655,3.455 0.345,3.455 0.345,2.345 0.655,2.345
  region: 0.155,3.455 -0.155,3.455 -0.155,2.345 0.155,2.345
  region: -0.345,3.455 -0.655,3.455 -0.655,2.345 -0.345,2.345
  region: -0.845,3.455 -1.155,3.455 -1.155,2.345 -0.845,2.345
  region: -1.345,3.455 -1.655,3.455 -1.655,2.345 -1.345,2.345
  region: -1.845,3.455 -2.155,3.455 -2.155,2.345 -1.845,2.345
  region: -2.345,3.455 -2.655,3.455 -2.655,2.345 -2.345,2.345
  region: -2.845,3.455 -3.155,3.455 -3.155,2.345 -2.845,2.345
  region: -3.345,3.455 -3.655,3.455 -3.655,2.345 -3.345,2.345
  region: -3.845,3.455 -4.155,3.455 -4.155,2.345 -3.845,2.345
  region: -4.345,3.455 -4.655,3.455 -4.655,2.345 -4.345,2.345
  region: -4.845,3.455 -5.155,3.455 -5.155,2.345 -4.845,2.345
  region: -5.345,3.455 -5.655,3.455 -5.655,2.345 -5.345,2.345
  region: -5.845,3.455 -6.155,3.455 -6.155,2.345 -5.845,2.345
Mechanical 16:
  rectangle: -6.11,-3.3 -5.88,-2.245
  rectangle: -5.61,-3.3 -5.38,-2.245
  rectangle: -5.11,-3.3 -4.88,-2.245
  rectangle: -4.61,-3.3 -4.38,-2.245
  rectangle: -4.11,-3.3 -3.88,-2.245
  rectangle: -3.61,-3.3 -3.38,-2.245
  rectangle: -3.11,-3.3 -2.88,-2.245
  rectangle: -2.61,-3.3 -2.38,-2.245
  rectangle: -2.11,-3.3 -1.88,-2.245
  rectangle: -1.61,-3.3 -1.38,-2.245
  rectangle: -1.11,-3.3 -0.88,-2.245
  rectangle: -0.61,-3.3 -0.38,-2.245
  rectangle: -0.11,-3.3 0.12,-2.245
  rectangle: 0.39,-3.3 0.62,-2.245
  rectangle: 0.89,-3.3 1.12,-2.245
  rectangle: 1.39,-3.3 1.62,-2.245
  rectangle: 1.89,-3.3 2.12,-2.245
  rectangle: 2.39,-3.3 2.62,-2.245
  rectangle: 2.89,-3.3 3.12,-2.245
  rectangle: 3.39,-3.3 3.62,-2.245
  rectangle: 3.89,-3.3 4.12,-2.245
  rectangle: 4.39,-3.3 4.62,-2.245
  rectangle: 4.89,-3.3 5.12,-2.245
  rectangle: 5.39,-3.3 5.62,-2.245
  rectangle: 5.89,-3.3 6.12,-2.245
  region: 6.11,3.3 5.88,3.3 5.88,2.245 6.11,2.245
  region: 5.61,3.3 5.38,3.3 5.38,2.245 5.61,2.245
  region: 5.11,3.3 4.88,3.3 4.88,2.245 5.11,2.245
  region: 4.61,3.3 4.38,3.3 4.38,2.245 4.61,2.245
  region: 4.11,3.3 3.88,3.3 3.88,2.245 4.11,2.245
  region: 3.61,3.3 3.38,3.3 3.38,2.245 3.61,2.245
  region: 3.11,3.3 2.88,3.3 2.88,2.245 3.11,2.245
  region: 2.61,3.3 2.38,3.3 2.38,2.245 2.61,2.245
  region: 2.11,3.3 1.88,3.3 1.88,2.245 2.11,2.245
  region: 1.61,3.3 1.38,3.3 1.38,2.245 1.61,2.245
  region: 1.11,3.3 0.88,3.3 0.88,2.245 1.11,2.245
  region: 0.61,3.3 0.38,3.3 0.38,2.245 0.61,2.245
  region: 0.11,3.3 -0.12,3.3 -0.12,2.245 0.11,2.245
  region: -0.39,3.3 -0.62,3.3 -0.62,2.245 -0.39,2.245
  region: -0.89,3.3 -1.12,3.3 -1.12,2.245 -0.89,2.245
  region: -1.39,3.3 -1.62,3.3 -1.62,2.245 -1.39,2.245
  region: -1.89,3.3 -2.12,3.3 -2.12,2.245 -1.89,2.245
  region: -2.39,3.3 -2.62,3.3 -2.62,2.245 -2.39,2.245
  region: -2.89,3.3 -3.12,3.3 -3.12,2.245 -2.89,2.245
  region: -3.39,3.3 -3.62,3.3 -3.62,2.245 -3.39,2.245
  region: -3.89,3.3 -4.12,3.3 -4.12,2.245 -3.89,2.245
  region: -4.39,3.3 -4.62,3.3 -4.62,2.245 -4.39,2.245
  region: -4.89,3.3 -5.12,3.3 -5.12,2.245 -4.89,2.245
  region: -5.39,3.3 -5.62,3.3 -5.62,2.245 -5.39,2.245
  region: -5.89,3.3 -6.12,3.3 -6.12,2.245 -5.89,2.245

## HTSSOP56DCA [mm]
pads (58):
  rect 0.3x1.1 smd: 1(-6.75,-3.75) 2(-6.25,-3.75) 3(-5.75,-3.75) 4(-5.25,-3.75) 5(-4.75,-3.75) 6(-4.25,-3.75) 7(-3.75,-3.75) 8(-3.25,-3.75) 9(-2.75,-3.75) 10(-2.25,-3.75) 11(-1.75,-3.75) 12(-1.25,-3.75) 13(-0.75,-3.75) 14(-0.25,-3.75) 15(0.25,-3.75) 16(0.75,-3.75) 17(1.25,-3.75) 18(1.75,-3.75) 19(2.25,-3.75) 20(2.75,-3.75) 21(3.25,-3.75) 22(3.75,-3.75) 23(4.25,-3.75) 24(4.75,-3.75) 25(5.25,-3.75) 26(5.75,-3.75) 27(6.25,-3.75) 28(6.75,-3.75) 29(6.75,3.75) 30(6.25,3.75) 31(5.75,3.75) 32(5.25,3.75) 33(4.75,3.75) 34(4.25,3.75) 35(3.75,3.75) 36(3.25,3.75) 37(2.75,3.75) 38(2.25,3.75) 39(1.75,3.75) 40(1.25,3.75) 41(0.75,3.75) 42(0.25,3.75) 43(-0.25,3.75) 44(-0.75,3.75) 45(-1.25,3.75) 46(-1.75,3.75) 47(-2.25,3.75) 48(-2.75,3.75) 49(-3.25,3.75) 50(-3.75,3.75) 51(-4.25,3.75) 52(-4.75,3.75) 53(-5.25,3.75) 54(-5.75,3.75) 55(-6.25,3.75) 56(-6.75,3.75)
  rect 7x5.1 smd: EXP@1(-3.5,0) EXP@2(3.5,0)
Top Overlay:
  circle w0.102: c-6.1,-2.2 r0.283
  lines w0.102: -7,-3.05 7,-3.05 7,3.05 -7,3.05 -7,-3.05
Top Paste:
  rectangle: -6.89,-4.285 -6.61,-3.215
  rectangle: -6.39,-4.285 -6.11,-3.215
  rectangle: -5.89,-4.285 -5.61,-3.215
  rectangle: -5.39,-4.285 -5.11,-3.215
  rectangle: -4.89,-4.285 -4.61,-3.215
  rectangle: -4.39,-4.285 -4.11,-3.215
  rectangle: -3.89,-4.285 -3.61,-3.215
  rectangle: -3.39,-4.285 -3.11,-3.215
  rectangle: -2.89,-4.285 -2.61,-3.215
  rectangle: -2.39,-4.285 -2.11,-3.215
  rectangle: -1.89,-4.285 -1.61,-3.215
  rectangle: -1.39,-4.285 -1.11,-3.215
  rectangle: -0.89,-4.285 -0.61,-3.215
  rectangle: -0.39,-4.285 -0.11,-3.215
  rectangle: 0.11,-4.285 0.39,-3.215
  rectangle: 0.61,-4.285 0.89,-3.215
  rectangle: 1.11,-4.285 1.39,-3.215
  rectangle: 1.61,-4.285 1.89,-3.215
  rectangle: 2.11,-4.285 2.39,-3.215
  rectangle: 2.61,-4.285 2.89,-3.215
  rectangle: 3.11,-4.285 3.39,-3.215
  rectangle: 3.61,-4.285 3.89,-3.215
  rectangle: 4.11,-4.285 4.39,-3.215
  rectangle: 4.61,-4.285 4.89,-3.215
  rectangle: 5.11,-4.285 5.39,-3.215
  rectangle: 5.61,-4.285 5.89,-3.215
  rectangle: 6.11,-4.285 6.39,-3.215
  rectangle: 6.61,-4.285 6.89,-3.215
  region: 6.89,4.285 6.61,4.285 6.61,3.215 6.89,3.215
  region: 6.39,4.285 6.11,4.285 6.11,3.215 6.39,3.215
  region: 5.89,4.285 5.61,4.285 5.61,3.215 5.89,3.215
  region: 5.39,4.285 5.11,4.285 5.11,3.215 5.39,3.215
  region: 4.89,4.285 4.61,4.285 4.61,3.215 4.89,3.215
  region: 4.39,4.285 4.11,4.285 4.11,3.215 4.39,3.215
  region: 3.89,4.285 3.61,4.285 3.61,3.215 3.89,3.215
  region: 3.39,4.285 3.11,4.285 3.11,3.215 3.39,3.215
  region: 2.89,4.285 2.61,4.285 2.61,3.215 2.89,3.215
  region: 2.39,4.285 2.11,4.285 2.11,3.215 2.39,3.215
  region: 1.89,4.285 1.61,4.285 1.61,3.215 1.89,3.215
  region: 1.39,4.285 1.11,4.285 1.11,3.215 1.39,3.215
  region: 0.89,4.285 0.61,4.285 0.61,3.215 0.89,3.215
  region: 0.39,4.285 0.11,4.285 0.11,3.215 0.39,3.215
  region: -0.11,4.285 -0.39,4.285 -0.39,3.215 -0.11,3.215
  region: -0.61,4.285 -0.89,4.285 -0.89,3.215 -0.61,3.215
  region: -1.11,4.285 -1.39,4.285 -1.39,3.215 -1.11,3.215
  region: -1.61,4.285 -1.89,4.285 -1.89,3.215 -1.61,3.215
  region: -2.11,4.285 -2.39,4.285 -2.39,3.215 -2.11,3.215
  region: -2.61,4.285 -2.89,4.285 -2.89,3.215 -2.61,3.215
  region: -3.11,4.285 -3.39,4.285 -3.39,3.215 -3.11,3.215
  region: -3.61,4.285 -3.89,4.285 -3.89,3.215 -3.61,3.215
  region: -4.11,4.285 -4.39,4.285 -4.39,3.215 -4.11,3.215
  region: -4.61,4.285 -4.89,4.285 -4.89,3.215 -4.61,3.215
  region: -5.11,4.285 -5.39,4.285 -5.39,3.215 -5.11,3.215
  region: -5.61,4.285 -5.89,4.285 -5.89,3.215 -5.61,3.215
  region: -6.11,4.285 -6.39,4.285 -6.39,3.215 -6.11,3.215
  region: -6.61,4.285 -6.89,4.285 -6.89,3.215 -6.61,3.215
Top Solder:
  rectangle: -6.905,-4.305 -6.595,-3.195
  rectangle: -6.405,-4.305 -6.095,-3.195
  rectangle: -5.905,-4.305 -5.595,-3.195
  rectangle: -5.405,-4.305 -5.095,-3.195
  rectangle: -4.905,-4.305 -4.595,-3.195
  rectangle: -4.405,-4.305 -4.095,-3.195
  rectangle: -3.905,-4.305 -3.595,-3.195
  rectangle: -3.405,-4.305 -3.095,-3.195
  rectangle: -2.905,-4.305 -2.595,-3.195
  rectangle: -2.405,-4.305 -2.095,-3.195
  rectangle: -1.905,-4.305 -1.595,-3.195
  rectangle: -1.405,-4.305 -1.095,-3.195
  rectangle: -0.905,-4.305 -0.595,-3.195
  rectangle: -0.405,-4.305 -0.095,-3.195
  rectangle: 0.095,-4.305 0.405,-3.195
  rectangle: 0.595,-4.305 0.905,-3.195
  rectangle: 1.095,-4.305 1.405,-3.195
  rectangle: 1.595,-4.305 1.905,-3.195
  rectangle: 2.095,-4.305 2.405,-3.195
  rectangle: 2.595,-4.305 2.905,-3.195
  rectangle: 3.095,-4.305 3.405,-3.195
  rectangle: 3.595,-4.305 3.905,-3.195
  rectangle: 4.095,-4.305 4.405,-3.195
  rectangle: 4.595,-4.305 4.905,-3.195
  rectangle: 5.095,-4.305 5.405,-3.195
  rectangle: 5.595,-4.305 5.905,-3.195
  rectangle: 6.095,-4.305 6.405,-3.195
  rectangle: 6.595,-4.305 6.905,-3.195
  region: 6.905,4.305 6.595,4.305 6.595,3.195 6.905,3.195
  region: 6.405,4.305 6.095,4.305 6.095,3.195 6.405,3.195
  region: 5.905,4.305 5.595,4.305 5.595,3.195 5.905,3.195
  region: 5.405,4.305 5.095,4.305 5.095,3.195 5.405,3.195
  region: 4.905,4.305 4.595,4.305 4.595,3.195 4.905,3.195
  region: 4.405,4.305 4.095,4.305 4.095,3.195 4.405,3.195
  region: 3.905,4.305 3.595,4.305 3.595,3.195 3.905,3.195
  region: 3.405,4.305 3.095,4.305 3.095,3.195 3.405,3.195
  region: 2.905,4.305 2.595,4.305 2.595,3.195 2.905,3.195
  region: 2.405,4.305 2.095,4.305 2.095,3.195 2.405,3.195
  region: 1.905,4.305 1.595,4.305 1.595,3.195 1.905,3.195
  region: 1.405,4.305 1.095,4.305 1.095,3.195 1.405,3.195
  region: 0.905,4.305 0.595,4.305 0.595,3.195 0.905,3.195
  region: 0.405,4.305 0.095,4.305 0.095,3.195 0.405,3.195
  region: -0.095,4.305 -0.405,4.305 -0.405,3.195 -0.095,3.195
  region: -0.595,4.305 -0.905,4.305 -0.905,3.195 -0.595,3.195
  region: -1.095,4.305 -1.405,4.305 -1.405,3.195 -1.095,3.195
  region: -1.595,4.305 -1.905,4.305 -1.905,3.195 -1.595,3.195
  region: -2.095,4.305 -2.405,4.305 -2.405,3.195 -2.095,3.195
  region: -2.595,4.305 -2.905,4.305 -2.905,3.195 -2.595,3.195
  region: -3.095,4.305 -3.405,4.305 -3.405,3.195 -3.095,3.195
  region: -3.595,4.305 -3.905,4.305 -3.905,3.195 -3.595,3.195
  region: -4.095,4.305 -4.405,4.305 -4.405,3.195 -4.095,3.195
  region: -4.595,4.305 -4.905,4.305 -4.905,3.195 -4.595,3.195
  region: -5.095,4.305 -5.405,4.305 -5.405,3.195 -5.095,3.195
  region: -5.595,4.305 -5.905,4.305 -5.905,3.195 -5.595,3.195
  region: -6.095,4.305 -6.405,4.305 -6.405,3.195 -6.095,3.195
  region: -6.595,4.305 -6.905,4.305 -6.905,3.195 -6.595,3.195
  rectangle: -6.995,-2.55 7,2.545
Mechanical 16:
  rectangle: -6.86,-4.15 -6.63,-3.095
  rectangle: -6.36,-4.15 -6.13,-3.095
  rectangle: -5.86,-4.15 -5.63,-3.095
  rectangle: -5.36,-4.15 -5.13,-3.095
  rectangle: -4.86,-4.15 -4.63,-3.095
  rectangle: -4.36,-4.15 -4.13,-3.095
  rectangle: -3.86,-4.15 -3.63,-3.095
  rectangle: -3.36,-4.15 -3.13,-3.095
  rectangle: -2.86,-4.15 -2.63,-3.095
  rectangle: -2.36,-4.15 -2.13,-3.095
  rectangle: -1.86,-4.15 -1.63,-3.095
  rectangle: -1.36,-4.15 -1.13,-3.095
  rectangle: -0.86,-4.15 -0.63,-3.095
  rectangle: -0.36,-4.15 -0.13,-3.095
  rectangle: 0.14,-4.15 0.37,-3.095
  rectangle: 0.64,-4.15 0.87,-3.095
  rectangle: 1.14,-4.15 1.37,-3.095
  rectangle: 1.64,-4.15 1.87,-3.095
  rectangle: 2.14,-4.15 2.37,-3.095
  rectangle: 2.64,-4.15 2.87,-3.095
  rectangle: 3.14,-4.15 3.37,-3.095
  rectangle: 3.64,-4.15 3.87,-3.095
  rectangle: 4.14,-4.15 4.37,-3.095
  rectangle: 4.64,-4.15 4.87,-3.095
  rectangle: 5.14,-4.15 5.37,-3.095
  rectangle: 5.64,-4.15 5.87,-3.095
  rectangle: 6.14,-4.15 6.37,-3.095
  rectangle: 6.64,-4.15 6.87,-3.095
  region: 6.86,4.15 6.63,4.15 6.63,3.095 6.86,3.095
  region: 6.36,4.15 6.13,4.15 6.13,3.095 6.36,3.095
  region: 5.86,4.15 5.63,4.15 5.63,3.095 5.86,3.095
  region: 5.36,4.15 5.13,4.15 5.13,3.095 5.36,3.095
  region: 4.86,4.15 4.63,4.15 4.63,3.095 4.86,3.095
  region: 4.36,4.15 4.13,4.15 4.13,3.095 4.36,3.095
  region: 3.86,4.15 3.63,4.15 3.63,3.095 3.86,3.095
  region: 3.36,4.15 3.13,4.15 3.13,3.095 3.36,3.095
  region: 2.86,4.15 2.63,4.15 2.63,3.095 2.86,3.095
  region: 2.36,4.15 2.13,4.15 2.13,3.095 2.36,3.095
  region: 1.86,4.15 1.63,4.15 1.63,3.095 1.86,3.095
  region: 1.36,4.15 1.13,4.15 1.13,3.095 1.36,3.095
  region: 0.86,4.15 0.63,4.15 0.63,3.095 0.86,3.095
  region: 0.36,4.15 0.13,4.15 0.13,3.095 0.36,3.095
  region: -0.14,4.15 -0.37,4.15 -0.37,3.095 -0.14,3.095
  region: -0.64,4.15 -0.87,4.15 -0.87,3.095 -0.64,3.095
  region: -1.14,4.15 -1.37,4.15 -1.37,3.095 -1.14,3.095
  region: -1.64,4.15 -1.87,4.15 -1.87,3.095 -1.64,3.095
  region: -2.14,4.15 -2.37,4.15 -2.37,3.095 -2.14,3.095
  region: -2.64,4.15 -2.87,4.15 -2.87,3.095 -2.64,3.095
  region: -3.14,4.15 -3.37,4.15 -3.37,3.095 -3.14,3.095
  region: -3.64,4.15 -3.87,4.15 -3.87,3.095 -3.64,3.095
  region: -4.14,4.15 -4.37,4.15 -4.37,3.095 -4.14,3.095
  region: -4.64,4.15 -4.87,4.15 -4.87,3.095 -4.64,3.095
  region: -5.14,4.15 -5.37,4.15 -5.37,3.095 -5.14,3.095
  region: -5.64,4.15 -5.87,4.15 -5.87,3.095 -5.64,3.095
  region: -6.14,4.15 -6.37,4.15 -6.37,3.095 -6.14,3.095
  region: -6.64,4.15 -6.87,4.15 -6.87,3.095 -6.64,3.095